# Altium footprint library PCBLIB.PcbLib: 103 footprints (part 2 of 7)
Each footprint in its own frame and in the unit in brackets; x right, y up, seen from the top. Pads: shape width x height; smd on the part's side, far side on the other; paste and mask are expansions set on the pad; w line width, h text height; cw(c..) or ccw(c..) is an arc to the next point about the centre after c.
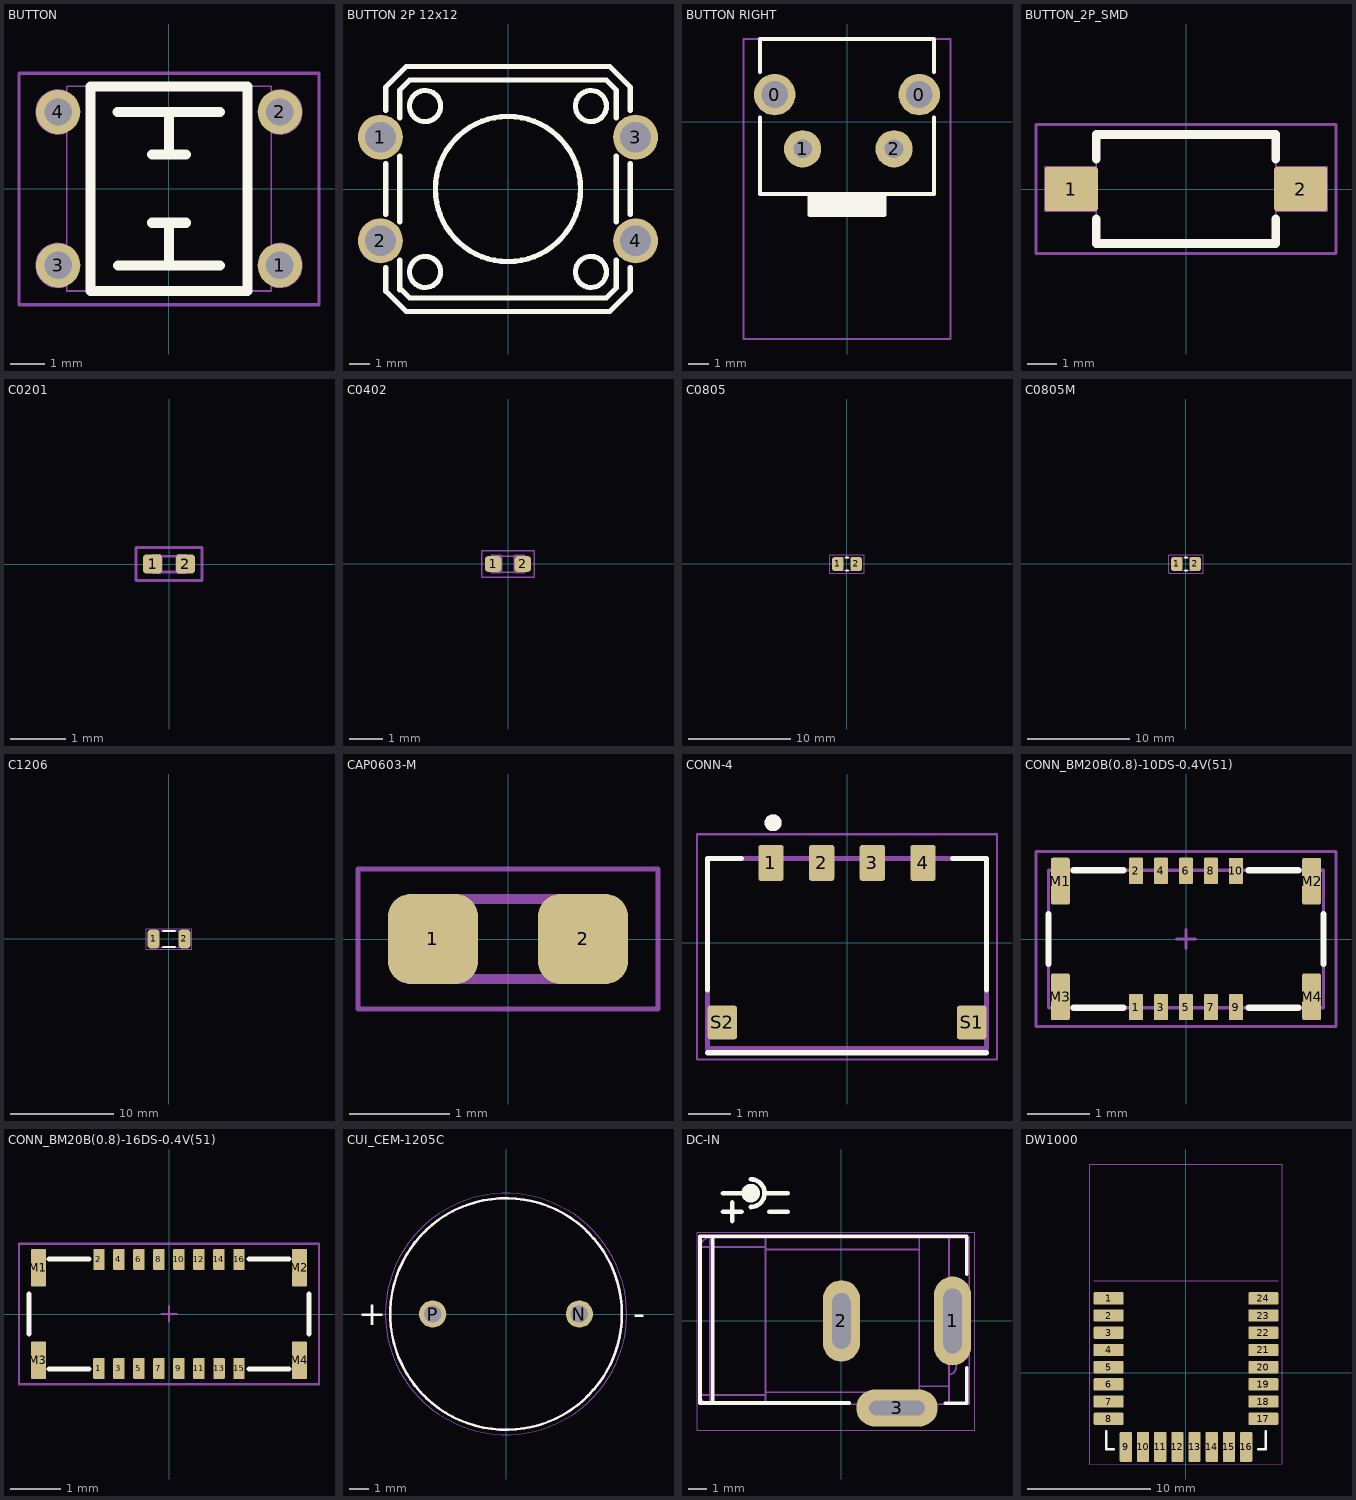
[diagram p1: the footprints below, top view; thin cyan lines are the x and y axes]

## BUTTON [mm]
pads (4):
  round 1.3 hole 0.8 mask+0.05: 1(3.25,-2.25) 2(3.25,2.25) 3(-3.25,-2.25) 4(-3.25,2.25)
Top Overlay:
  lines w0.3: -1.5,-2.25 1.5,-2.25 ; -1.5,2.25 1.5,2.25 ; -0.5,-1 0.5,-1 ; -0.5,1 0.5,1 ; 0,-2.25 0,-1 ; 0,1 0,2.25 ; -2.3,-3 -2.3,3 2.3,3 2.3,-3 -2.3,-3
Mechanical 1:
  lines w0.05: -3.017,-2.857 cw(c-3.25,-2.25) -3.017,-1.643 ; -3.017,1.643 cw(c-3.25,2.25) -3.017,2.857 ; 3.017,-2.857 ccw(c3.25,-2.25) 3.017,-1.643 ; 3.017,1.643 ccw(c3.25,2.25) 3.017,2.857 ; -3,-3 -3,3 3,3 3,-3 -3,-3
Top Component Outline:
  lines w0.1: -4.4,-3.41 4.4,-3.41 4.4,3.39 -4.4,3.39 -4.4,0.79 -4.4,-3.41
3D body "buttona.stp": height 5, standoff -3.5, extent -3.95,-3.1 3.95,3.1

## BUTTON 2P 12x12 [mm]
pads (4):
  round 2.2 hole 1.5: 1(-6.251,2.54) 2(-6.251,-2.54) 3(6.251,2.54) 4(6.251,-2.54)
Top Overlay:
  circle w0.254: c0,0 r3.556
  circle w0.254: c4.064,-4.064 r0.762
  circle w0.254: c-4.064,-4.064 r0.762
  circle w0.254: c4.064,4.064 r0.762
  circle w0.254: c-4.064,4.064 r0.762
  lines w0.254: -5.994,-5.016 -5.994,-3.846 ; -5.994,-5.004 -5.004,-5.994 ; -5.994,-1.234 -5.994,1.234 ; -5.994,3.846 -5.994,5.004 -5.004,5.994 ; -5.309,-4.941 -5.309,-3.479 ; -5.309,-4.851 -4.826,-5.334 4.826,-5.334 5.309,-4.851 5.309,-3.479 ; -5.309,-1.601 -5.309,1.601 ; -5.309,3.479 -5.309,4.851 -4.826,5.334 4.826,5.334 5.309,4.851 5.309,3.479 ; -5,-6 5,-6 ; -5,6 5,6 ; 5.004,-5.994 5.994,-5.004 5.994,-3.846 ; 5.004,5.994 5.994,5.004 5.994,3.846 ; 5.309,-1.601 5.309,1.601 ; 5.994,-1.234 5.994,1.234
Bottom 3D Body:
  lines w0.003: 0,0.397 0,0.398
3D body "Tactal Switch - THRU(12mmx12mmx8mm)-Green.stp": height 7.87, standoff -3.05, extent -6.708,-6.007 6.708,6.007

## BUTTON RIGHT [mm] "BUTTON NGHIENG"
height 9
pads (4):
  round 2 hole 1.3: 0(-3.492,1.308) 0(3.492,1.308)
  round 1.8 hole 0.9: 1(-2.146,-1.308) 2(2.273,-1.308)
Top Overlay:
  region: -1.8,-4.5 1.8,-4.5 1.8,-3.4 -1.8,-3.4
  lines w0.2: -4.2,0.2 -4.2,-3.5 -1.8,-3.5 -1.8,-4.5 1.8,-4.5 1.8,-3.5 4.2,-3.5 4.2,0.2 ; -4.2,2.4 -4.2,4 4.2,4 4.2,2.4
Top Component Outline:
  lines w0.1: -5,-10.5 -5,4 5,4 5,-10.5 -5,-10.5
3D body "Kfc-a06w2-10.stp": height 10.54, standoff -3.39, extent -4.176,-9.903 4.202,4.026

## BUTTON_2P_SMD [mm]
pads (2):
  rrect10% 1.8x1.5 smd mask+0.05: 1(-3.9,0) 2(3.9,0)
Top Overlay:
  lines w0.3: -3.05,-1.025 -3.05,-1.85 ; -3.05,1.025 -3.05,1.85 ; 2.2,-1.85 -3.05,-1.85 ; 2.2,1.85 -3.05,1.85 ; 3.05,-1.025 3.05,-1.85 -3.05,-1.85 ; 3.05,1.025 3.05,1.85 -3.05,1.85
Mechanical 1:
  lines w0.05: -3.05,-0.75 -4.8,-0.75 -4.8,0.75 -3.05,0.75 ; 3.05,-0.75 4.8,-0.75 4.8,0.75 3.05,0.75 ; -3.05,-1.85 3.05,-1.85 3.05,1.85 -3.05,1.85 -3.05,-1.85
Top Component Outline:
  lines w0.1: -5.1,-2.2 5.1,-2.2 5.1,2.2 -5.1,2.2 -5.1,-2.2
Top Designator:
  text ".Value" at 1.069,0.299 h0.8
3D body "User Library-KFC-2Pin SMD.step": height 4.2, standoff 0, extent -4.075,-1.675 3.925,1.825

## C0201 [mm]
pads (2):
  rrect40% 0.35x0.35 smd mask+0.05: 1(-0.3,0) 2(0.3,0)
Top Component Outline:
  lines w0.05: -0.6,-0.3 -0.6,0.3 0.6,0.3 0.6,-0.3 -0.6,-0.3
Top Assembly:
  drawing of 22 lines, arcs and shapes, not listed
3D body "CAP0201.step": height 0.3, standoff 0, extent -0.3,-0.15 0.3,0.15

## C0402 [mm] "Chip Capacitor, 2-Leads, Body 1.00x0.50mm, IPC Medium Density"
height 0.65
pads (2):
  rrect50% 0.5x0.5 smd mask+0.05: 1(-0.45,0) 2(0.45,0)
Top Component Outline:
  lines w0.05: -0.8,-0.4 0.8,-0.4 0.8,0.4 -0.8,0.4 -0.8,-0.4
Top Assembly:
  drawing of 22 lines, arcs and shapes, not listed
Top Designator:
  text ".Comment" at -0.5,-0.2 h0.64
3D body "CAP0402.step": height 0.55, standoff 0, extent -0.5,-0.25 0.5,0.25

## C0805 [mm] "Chip Capacitor, 2-Leads, Body 2.00x1.25mm, IPC Medium Density"
height 0.85
pads (2):
  rrect50% 1.15x1.4 smd mask+0.05: 1(-0.9,0) 2(0.9,0)
Top Overlay:
  lines w0.2: -0.1,-0.62 0.1,-0.62 ; -0.1,0.615 0.1,0.615
Top Component Outline:
  lines w0.05: -1.7,-0.9 1.7,-0.9 1.7,0.9 -1.7,0.9 -1.7,-0.9
Top Assembly:
  region: -1.051,-0.624 -1.053,-0.599 -1.056,-0.549 -1.06,-0.499 -1.063,-0.449 -1.064,-0.424 -1.071,-0.293 -1.076,-0.03 -1.073,0.234 -1.061,0.497 -1.05,0.628 -1.05,0.638 -1.041,0.655 -1.027,0.668 -1.01,0.675 -1,0.675 -0.505,0.675 -0.494,0.675 -0.474,0.667 -0.458,0.651 -0.45,0.631 -0.45,0.62 -0.45,-0.62 -0.45,-0.631 -0.458,-0.651 -0.474,-0.667 -0.494,-0.675 -0.505,-0.675 -0.506,-0.675 -0.995,-0.675 -1,-0.675 -1.01,-0.673 -1.019,-0.67 -1.027,-0.664 -1.03,-0.661 -1.035,-0.658 -1.042,-0.65 -1.047,-0.64 -1.05,-0.63
  region: 0.5,-0.62 0.5,-0.621 0.501,-0.623 0.502,-0.624 0.504,-0.625 0.505,-0.625 0.995,-0.625 0.996,-0.625 0.998,-0.624 0.999,-0.623 1,-0.621 1,-0.62 1.001,-0.617 1.011,-0.487 1.023,-0.226 1.026,0.035 1.02,0.296 1.013,0.427 1.012,0.451 1.009,0.501 1.006,0.551 1.002,0.6 1,0.625 0.505,0.625 0.504,0.625 0.502,0.624 0.501,0.623 0.5,0.621 0.5,0.62
  lines w0.1: -1,-0.62 cw(c6.757,-0.005) -1.014,-0.421 cw(c6.841,0) -1,0.624 ; -1,0.625 -0.505,0.625 cw(c-0.505,0.62) -0.5,0.62 -0.5,-0.62 ; -0.995,-0.625 -0.505,-0.625 ccw(c-0.505,-0.62) -0.5,-0.62 ; -0.5,0.615 0.5,0.615 ; -0.5,-0.62 0.5,-0.62 ; 0.5,-0.62 ccw(c0.505,-0.62) 0.505,-0.625 0.995,-0.625 ccw(c0.995,-0.62) 1,-0.62 1,-0.62 1.001,-0.617 ccw(c-6.841,0) 1.013,0.427 ccw(c-6.757,0.005) 1,0.625 0.505,0.625 ccw(c0.505,0.62) 0.5,0.62 0.5,-0.62
Top Designator:
  text ".Designator" at -1.578,-0.158 h0.7
Bottom Designator:
  text ".Comment" at -0.5,-0.2 h0.64
3D body "CAP0805.step": height 0.9, standoff 0, extent -1,-0.625 1,0.625

## C0805M [mm] "Chip Capacitor, 2-Leads, Body 2.00x1.25mm, IPC Medium Density"
height 0.85
pads (2):
  rrect50% 1.15x1.4 smd mask+0.05: 1(-0.9,0) 2(0.9,0)
Top Overlay:
  lines w0.2: -0.1,-0.62 0.1,-0.62 ; -0.1,0.615 0.1,0.615
Top Component Outline:
  lines w0.05: -1.7,-0.9 1.7,-0.9 1.7,0.9 -1.7,0.9 -1.7,-0.9
Top Assembly:
  region: -1.051,-0.624 -1.053,-0.599 -1.056,-0.549 -1.06,-0.499 -1.063,-0.449 -1.064,-0.424 -1.071,-0.293 -1.076,-0.03 -1.073,0.234 -1.061,0.497 -1.05,0.628 -1.05,0.638 -1.041,0.655 -1.027,0.668 -1.01,0.675 -1,0.675 -0.505,0.675 -0.494,0.675 -0.474,0.667 -0.458,0.651 -0.45,0.631 -0.45,0.62 -0.45,-0.62 -0.45,-0.631 -0.458,-0.651 -0.474,-0.667 -0.494,-0.675 -0.505,-0.675 -0.506,-0.675 -0.995,-0.675 -1,-0.675 -1.01,-0.673 -1.019,-0.67 -1.027,-0.664 -1.03,-0.661 -1.035,-0.658 -1.042,-0.65 -1.047,-0.64 -1.05,-0.63
  region: 0.5,-0.62 0.5,-0.621 0.501,-0.623 0.502,-0.624 0.504,-0.625 0.505,-0.625 0.995,-0.625 0.996,-0.625 0.998,-0.624 0.999,-0.623 1,-0.621 1,-0.62 1.001,-0.617 1.011,-0.487 1.023,-0.226 1.026,0.035 1.02,0.296 1.013,0.427 1.012,0.451 1.009,0.501 1.006,0.551 1.002,0.6 1,0.625 0.505,0.625 0.504,0.625 0.502,0.624 0.501,0.623 0.5,0.621 0.5,0.62
  lines w0.1: -1,-0.62 cw(c6.757,-0.005) -1.014,-0.421 cw(c6.841,0) -1,0.624 ; -1,0.625 -0.505,0.625 cw(c-0.505,0.62) -0.5,0.62 -0.5,-0.62 ; -0.995,-0.625 -0.505,-0.625 ccw(c-0.505,-0.62) -0.5,-0.62 ; -0.5,0.615 0.5,0.615 ; -0.5,-0.62 0.5,-0.62 ; 0.5,-0.62 ccw(c0.505,-0.62) 0.505,-0.625 0.995,-0.625 ccw(c0.995,-0.62) 1,-0.62 1,-0.62 1.001,-0.617 ccw(c-6.841,0) 1.013,0.427 ccw(c-6.757,0.005) 1,0.625 0.505,0.625 ccw(c0.505,0.62) 0.5,0.62 0.5,-0.62
Top Designator:
  text ".Designator" at -1.578,-0.158 h0.7
Bottom Designator:
  text ".Comment" at -0.5,-0.2 h0.64
3D body "CAPC2012X14N.step": height 1.45, standoff 0, extent -1.1,-0.725 1.1,0.725

## C1206 [mm]
pads (2):
  rrect50% 1.15x1.8 smd mask+0.05: 1(-1.5,0) 2(1.5,0)
Top Overlay:
  lines w0.2: -0.6,-0.795 0.6,-0.795 ; -0.6,0.79 0.6,0.79
Top Component Outline:
  lines w0.05: -2.2,-1 -2.2,1 2.2,1 2.2,-1 -2.2,-1
Top Assembly:
  region: -1.678,-0.443 -1.678,-0.442 -1.686,-0.306 -1.691,-0.032 -1.688,0.241 -1.675,0.514 -1.664,0.65 -1.663,0.669 -1.659,0.707 -1.656,0.744 -1.652,0.782 -1.651,0.8 -1.651,0.801 -1.65,0.802 -1.65,0.803 -1.65,0.812 -1.642,0.83 -1.628,0.843 -1.61,0.85 -1.6,0.85 -1.105,0.85 -1.094,0.85 -1.074,0.842 -1.058,0.826 -1.05,0.806 -1.05,0.795 -1.05,-0.795 -1.05,-0.806 -1.058,-0.826 -1.074,-0.842 -1.094,-0.85 -1.105,-0.85 -1.595,-0.85 -1.6,-0.85 -1.609,-0.849 -1.618,-0.845 -1.626,-0.84 -1.63,-0.836 -1.634,-0.833 -1.641,-0.825 -1.647,-0.816 -1.65,-0.806 -1.651,-0.8 -1.653,-0.781 -1.656,-0.742 -1.66,-0.703 -1.663,-0.665 -1.664,-0.645 -1.667,-0.62 -1.67,-0.569 -1.674,-0.519 -1.677,-0.468
  region: 1.1,-0.795 1.1,-0.796 1.101,-0.798 1.102,-0.799 1.104,-0.8 1.105,-0.8 1.595,-0.8 1.596,-0.8 1.598,-0.799 1.599,-0.798 1.6,-0.796 1.6,-0.795 1.6,-0.796 1.601,-0.791 1.603,-0.772 1.606,-0.734 1.61,-0.696 1.613,-0.659 1.614,-0.64 1.625,-0.504 1.638,-0.232 1.641,0.041 1.635,0.313 1.627,0.449 1.626,0.474 1.623,0.524 1.619,0.573 1.616,0.623 1.614,0.648 1.612,0.667 1.609,0.705 1.606,0.743 1.602,0.781 1.6,0.8 1.105,0.8 1.104,0.8 1.102,0.799 1.101,0.798 1.1,0.796 1.1,0.795
  lines w0.1: -1.6,-0.795 cw(c6.287,-0.011) -1.614,-0.641 cw(c6.368,-0.005) -1.628,-0.44 cw(c6.457,0) -1.614,0.646 cw(c6.288,0.011) -1.6,0.795 ; -1.6,0.8 -1.105,0.8 cw(c-1.105,0.795) -1.1,0.795 -1.1,-0.795 ; -1.595,-0.8 -1.105,-0.8 ccw(c-1.105,-0.795) -1.1,-0.795 ; -1.1,0.79 1.1,0.79 ; -1.1,-0.795 1.1,-0.795 ; 1.1,-0.795 ccw(c1.105,-0.795) 1.105,-0.8 1.595,-0.8 ccw(c1.595,-0.795) 1.6,-0.795 ; 1.1,-0.795 1.1,0.795 cw(c1.105,0.795) 1.105,0.8 1.6,0.8 cw(c-6.286,0.011) 1.614,0.648 cw(c-6.368,0.005) 1.627,0.449 cw(c-6.457,0) 1.614,-0.64 cw(c-6.288,-0.011) 1.601,-0.791 1.6,-0.796 ; 1.6,-0.795 1.6,-0.796
Top Designator:
  text ".Designator" at 1.689,0.17 h0.75
Bottom Designator:
  text ".Comment" at -0.5,-0.2 h0.64
Mechanical 11:
  text ".Designator" at -0.5,-0.2 h0.64
3D body "CAP1206.step": height 1, standoff 0, extent -1.64,-0.8 1.64,0.8

## CAP0603-M [mm] "CAP CER 0603 ( 1608 Metric )  / https://content.kemet.com/datasheets/KEM_C1006_X5R_SMD.pdf"
height 1.1
pads (2):
  rrect50% 0.9x0.9 smd mask+0.05: 1(-0.75,0) 2(0.75,0)
Top Component Outline:
  lines w0.05: -1.5,-0.7 -1.5,0.7 1.5,0.7 1.5,-0.7 -1.5,-0.7
Top Assembly:
  lines w0.1: -0.8,-0.4 0.8,-0.4 0.8,0.4 -0.8,0.4 -0.8,-0.4
Top Designator:
  text ".Designator" at -1.578,-0.158 h0.7
Bottom Designator:
  text ".Comment" at -0.5,-0.2 h0.64
Mechanical 11:
  text ".Designator" at -0.5,-0.2 h0.64
3D body "CAP0603.step": height 0.8, standoff 0, extent -0.8,-0.4 0.8,0.4

## CONN-4 [mm]
pads (6):
  rrect20% 0.6x0.85 smd mask+0.05: 1(-1.8,1.887) 2(-0.6,1.887) 3(0.6,1.887) 4(1.8,1.887)
  rrect20% 0.7x0.8 smd mask+0.05: S1(2.95,-1.887) S2(-2.95,-1.887)
Top Overlay:
  circle w0.2: c-1.75,2.838 r0.1
  lines w0.127: -3.3,-2.608 3.3,-2.608 ; -3.3,-1.112 -3.3,1.993 -2.5,1.993 ; 2.5,1.993 3.3,1.993 3.3,-1.112
Top Component Outline:
  lines w0.05: -3.55,-2.763 -3.55,2.568 3.55,2.568 3.55,-2.763 -3.55,-2.763
Top Assembly:
  circle w0.2: c-1.75,2.838 r0.1
  lines w0.127: -3.3,-2.508 -3.3,1.993 3.3,1.993 3.3,-2.508 -3.3,-2.508
3D body "step_temp.STEP": height 1.5, standoff 0.05, extent -3.3,-2.431 3.3,2.1

## CONN_BM20B(0.8)-10DS-0.4V(51) [mm]
height 0.6
pads (14):
  rrect20% 0.23x0.42 smd mask+0.05: 1(-0.8,-1.09) 2(-0.8,1.09) 3(-0.4,-1.09) 4(-0.4,1.09) 5(0,-1.09) 6(0,1.09) 7(0.4,-1.09) 8(0.4,1.09) 9(0.8,-1.09) 10(0.8,1.09)
  rrect20% 0.3x0.75 smd mask+0.05: M1(-2.01,0.925) M2(2.01,0.925) M3(-2.01,-0.925) M4(2.01,-0.925)
Top Overlay:
  lines w0.1: -2.2,-0.4 -2.2,0.4 ; -1.8,-1.1 -1,-1.1 ; -1.8,1.1 -1,1.1 ; 1,-1.1 1.8,-1.1 ; 1,1.1 1.8,1.1 ; 2.2,-0.4 2.2,0.4
Top Component Center:
  lines w0.05: -0.15,0 0.15,0 ; 0,-0.15 0,0.15
Top Component Outline:
  lines w0.05: -2.4,-1.4 2.4,-1.4 2.4,1.4 -2.4,1.4 -2.4,-1.4 ; -2.2,-1.1 2.2,-1.1 2.2,1.1 -2.2,1.1 -2.2,-1.1
Top Assembly:
  text ".Designator" at 1.853,0.007 h0.7
Top Designator:
  text ".Designator" at 0.975,0.105 h0.4
3D body "BM20B(0.8)-10DS-0.4V.stp": height 0.8, standoff 0, extent -2.24,-1.136 2.24,1.164

## CONN_BM20B(0.8)-16DS-0.4V(51) [mm]
height 0.6
pads (20):
  rrect20% 0.23x0.42 smd mask+0.05: 1(-1.4,-1.09) 2(-1.4,1.09) 3(-1,-1.09) 4(-1,1.09) 5(-0.6,-1.09) 6(-0.6,1.09) 7(-0.2,-1.09) 8(-0.2,1.09) 9(0.2,-1.09) 10(0.2,1.09) 11(0.6,-1.09) 12(0.6,1.09) 13(1,-1.09) 14(1,1.09) 15(1.4,-1.09) 16(1.4,1.09)
  rrect20% 0.3x0.75 smd mask+0.05: M1(-2.61,0.925) M2(2.61,0.925) M3(-2.61,-0.925) M4(2.61,-0.925)
Top Overlay:
  lines w0.1: -2.8,-0.4 -2.8,0.4 ; -2.4,-1.1 -1.6,-1.1 ; -2.4,1.1 -1.6,1.1 ; 1.6,-1.1 2.4,-1.1 ; 1.6,1.1 2.4,1.1 ; 2.8,-0.4 2.8,0.4
Top Component Center:
  lines w0.05: -0.15,0 0.15,0 ; 0,-0.15 0,0.15
Top Component Outline:
  lines w0.05: -3,-1.4 -3,1.4 3,1.4 3,-1.4 -3,-1.4
Top Assembly:
  text ".Designator" at 2.252,-0.226 h1
3D body "BM20B(0.8)-16DS-0.4V.stp": height 0.8, standoff 0, extent -2.84,-1.15 2.84,1.15

## CUI_CEM-1205C [mm]
pads (2):
  round 1.408 hole 0.9: N(3.8,0) P(-3.8,0)
Top Overlay:
  circle w0.127: c0,0 r6
  text "+" at -7.667,-0.572 h1.27
  text "-" at 6.598,-0.572 h1.27
Top Component Outline:
  circle w0.05: c0,0 r6.25
Bottom Courtyard:
  circle w0.127: c0,0 r6
3D body "User Library-Buzzer CEM-1205C.STEP": height 9, standoff -4, extent -6,-5.999 6,5.999

## DC-IN [mm] "Jac DC input"
height 5.08
pads (3):
  oval 2x4.8 hole 1 slot 3.5 at 90 deg mask+0.05: 1(6,0)
  oval 2x4.4 hole 1 slot 3 at 90 deg mask+0.05: 2(0,0)
  oval 4.4x2 hole 0.8 slot 3 at 0 deg mask+0.05: 3(3,-4.7)
Top Overlay:
  circle w0.5: c-4.9,6.9 r0.25
  lines w0.2: -6.954,-4.445 -6.954,4.572 ; 0.412,-4.428 -7.638,-4.428 -7.638,4.572 6.762,4.572 6.762,2.54 ; 5.619,-4.445 6.762,-4.445 6.762,-4.428 6.762,-2.54
  lines w0.254: -6.4,5.9 -5.4,5.9 ; -6.4,6.9 -4.9,6.9 ; -5.9,5.4 -5.9,6.4 ; -4.9,6.15 ccw(c-4.9,6.9) -4.9,7.65 ; -4.15,6.9 -2.9,6.9 ; -3.9,5.9 -2.9,5.9
Top Designator:
  text ".Designator" at -0.142,-2.128 h0.7
Bottom Courtyard:
  region: 0.35,-1.207 0.351,-1.207 0.354,-1.206 0.356,-1.204 0.357,-1.201 0.357,-1.2 0.357,1.2 0.357,1.201 0.356,1.204 0.354,1.206 0.351,1.207 0.35,1.207 0.04,1.207 0.039,1.207 0.036,1.206 0.034,1.204 0.033,1.201 0.033,1.2 0.033,-1.2 0.033,-1.201 0.034,-1.204 0.036,-1.206 0.039,-1.207 0.04,-1.207
  region: 6.205,1.2 5.795,1.2 5.795,-1.2 6.205,-1.2
  region: 4.2,-5 4.2,-4.59 1.8,-4.59 1.8,-5
  lines w0.1: -4.1,-3.85 4.2,-3.85 ; -4.1,3.85 4.2,3.85 ; 1.8,-4.5 1.8,-4.59 ; 4.2,-3.523 5.8,-3.523 ; 5.8,-2.9 ccw(c5.79,-2.49) 6.2,-2.49 6.2,-1.773 ; 5.8,-1.773 6.2,-1.773 ; 5.8,2.1 6.2,2.1 6.2,-1.773 ; 6.2,-1.4 6.9,-1.4 6.9,-4.5 5.8,-4.5 ; 6.2,-1.25 ccw(c6.3,-1.25) 6.4,-1.25 6.4,1.25 ccw(c6.3,1.25) 6.2,1.25 ; 6.2,1.4 6.9,1.4 6.9,4.5 5.8,4.5 ; -7.6,-4 ccw(c-7.1,-4) -7.1,-4.5 ; -7.6,-4 -7.1,-4 ; -7.6,-4 -7.6,4 ; -7.6,4 cw(c-7.1,4) -7.1,4.5 ; -7.6,4 -7.1,4 ; -7.1,-4.5 -4.1,-4.5 ; -7.1,-4.5 -7.1,-4 ; -7.1,-4 -4.1,-4 ; -7.1,-4 -7.1,4 ; -7.1,4 -4.1,4 ; -7.1,4 -7.1,4.5 ; -7.1,4.5 -4.1,4.5 ; -4.1,-4.5 -4.1,-4 ; -4.1,-4.5 4.2,-4.5 ; -4.1,-4 -4.1,4 ; -4.1,4 -4.1,4.5 ; -4.1,4.5 4.2,4.5 ; 1.8,-4.59 4.2,-4.59 ; 1.8,-4.59 1.8,-5 4.2,-5 4.2,-4.59 ; 4.2,-4.59 4.2,-4.5 ; 4.2,-4.5 5.8,-4.5 ; 4.2,-4.5 4.2,-3.85 ; 4.2,-3.85 4.2,3.85 ; 4.2,3.85 4.2,4.5 ; 4.2,4.5 5.8,4.5 ; 5.8,-4.5 5.8,-3.523 ; 5.8,-3.523 5.8,4.5
Bottom 3D Body:
  lines w0.05: -7.8,-5.9 7.2,-5.9 7.2,4.8 -7.8,4.8 -7.8,-5.9
3D body "CUI_DEVICES_PJ-002BH.step": height 11.1, standoff -3.4, extent -7.677,-4.826 6.723,4.574

## DW1000 [mm]
height 9
pads (24):
  rrect20% 2.45x1 smd paste+0 mask+0.05: 1(-6.295,6.048) 2(-6.295,4.648) 3(-6.295,3.248) 4(-6.295,1.848) 5(-6.295,0.448) 6(-6.295,-0.952) 7(-6.295,-2.352) 8(-6.295,-3.752) 17(6.295,-3.752) 18(6.295,-2.352) 19(6.295,-0.952) 20(6.295,0.448) 21(6.295,1.848) 22(6.295,3.248) 23(6.295,4.648) 24(6.295,6.048)
  rrect20% 1x2.45 smd paste+0 mask+0.05: 9(-4.9,-6.047) 10(-3.5,-6.047) 11(-2.1,-6.047) 12(-0.7,-6.047) 13(0.7,-6.047) 14(2.1,-6.047) 15(3.5,-6.047) 16(4.9,-6.047)
Top Overlay:
  lines w0.2: -6.5,-4.752 -6.5,-6.252 -5.9,-6.252 ; 5.9,-6.252 6.5,-6.252 6.5,-4.753
Top Component Outline:
  lines w0.1: -7.825,-7.437 -7.825,16.988 7.825,16.988 7.825,-7.437 -7.825,-7.437
Top Assembly:
  lines w0.1: -7.5,7.5 7.5,7.5
3D body "DWM1000 Module.x_t": height 2.9, standoff 0, extent -6.6,-6.252 6.6,16.748